# Altium footprint library 20210518.PcbLib: 414 footprints (part 9 of 26)
Each footprint in its own frame and in the unit in brackets; x right, y up, seen from the top. Pads: shape width x height; smd on the part's side, far side on the other; paste and mask are expansions set on the pad; w line width, h text height; cw(c..) or ccw(c..) is an arc to the next point about the centre after c.
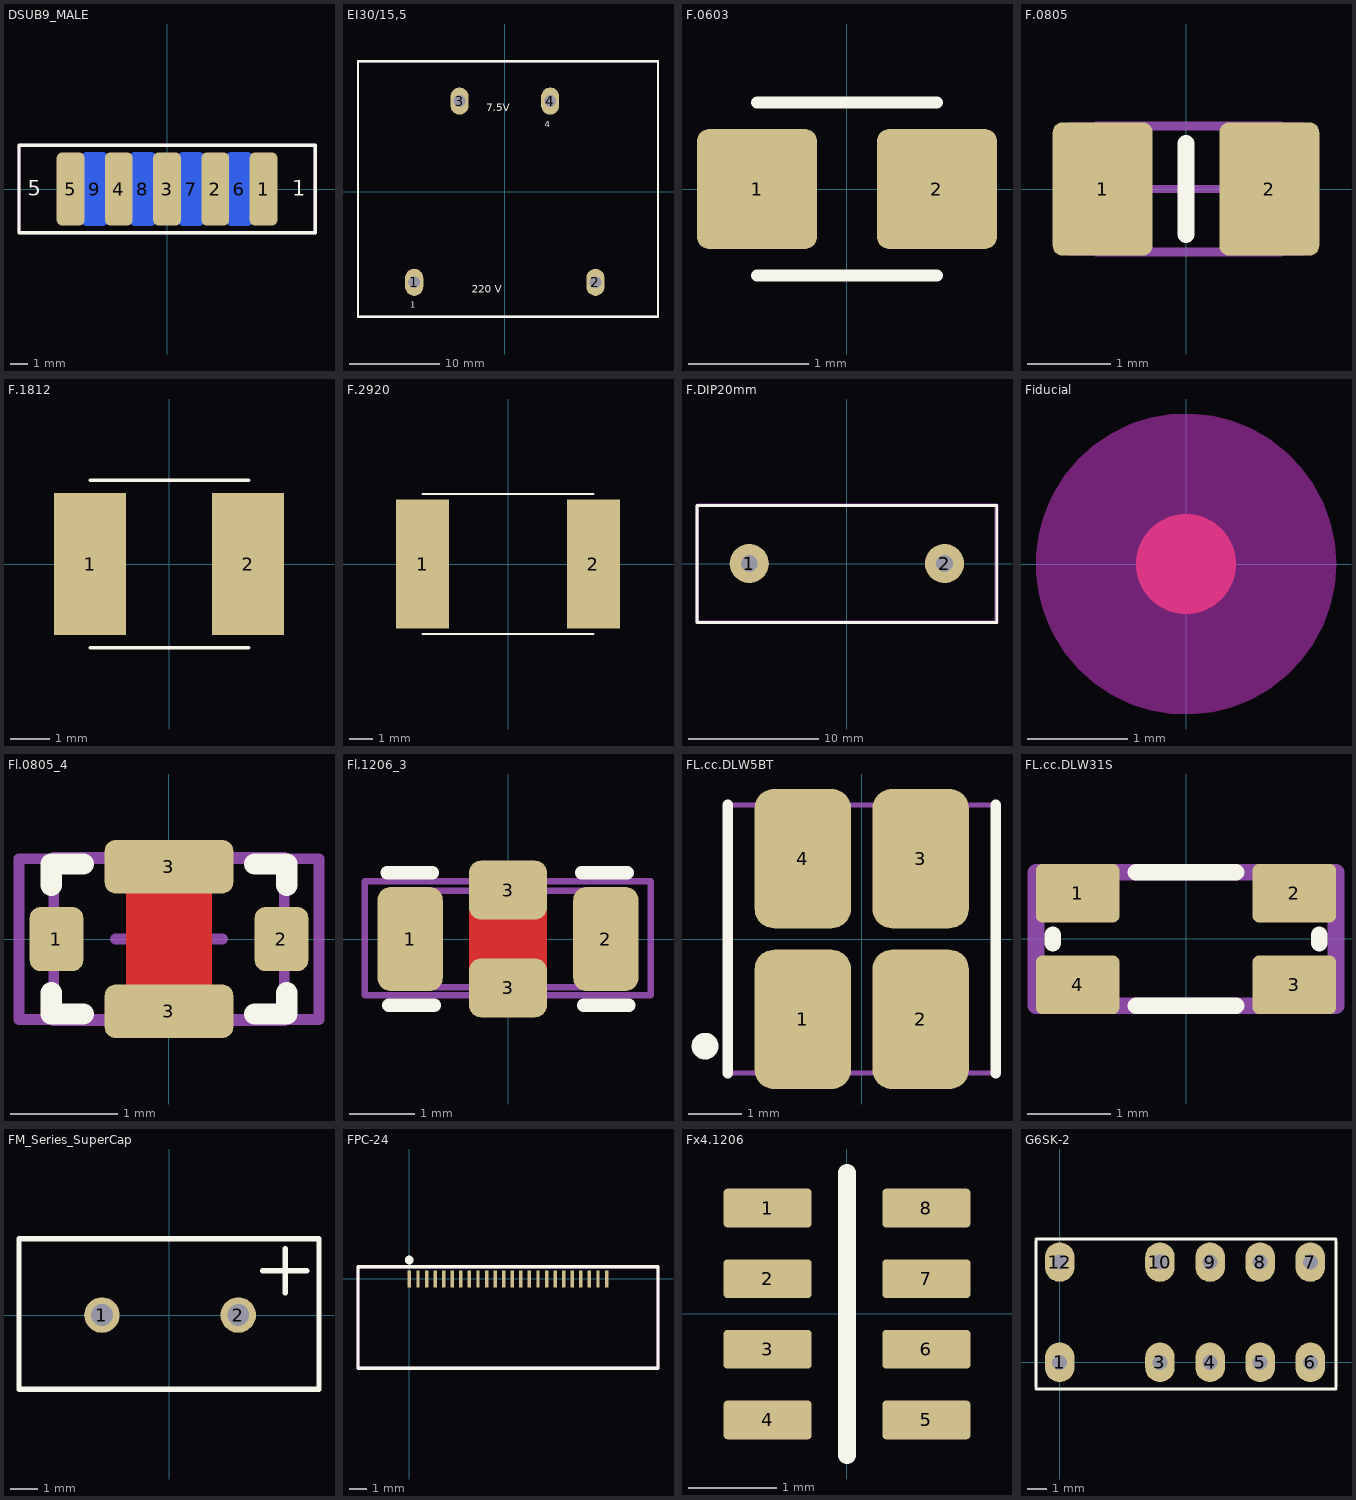
[diagram p8: the footprints below, top view; thin cyan lines are the x and y axes]

## DSUB9_MALE [mm] "Desub; 9 Position, 2.5mm pin space"
height 12.54
pads (9):
  rrect40% 1.6x4.2 smd paste-1: 1(5.54,0) 2(2.77,0) 3(0,0) 4(-2.77,0) 5(-5.54,0)
  rrect40% 1.6x4.2 smd far side paste-1: 6(4.155,0) 7(1.385,0) 8(-1.385,0) 9(-4.155,0)
Top Overlay:
  lines w0.2: -8.5,-2.5 -8.5,2.5 8.5,2.5 8.5,-2.5 -8.5,-2.5
  text "5" at -8,-0.7 h1.52
  text "1" at 7.2,-0.7 h1.52
Bottom Overlay:
  text "6" at 7.9,-0.7 h1.52
  text "9" at -7,-0.7 h1.52
Mechanical 13:
  lines w0.2: -8.5,-2.5 8.5,-2.5 8.5,2.5 -8.5,2.5 -8.5,-2.5
Mechanical 15:
  lines w0.2: -8.5,-2.5 8.5,-2.5 8.5,2.5 -8.5,2.5 -8.5,-2.5
3D body: height 6.21, standoff -6.21, extent -15.235,-0.466 15.435,13.83

## EI30/15,5 [mm]
pads (4):
  oval 2x3 / inner oval 2.5x3.5 / far side oval 2x3 hole 1.3: 1(-10,-10) 2(10,-10) 3(-5,10) 4(5,10)
Top Overlay:
  lines w0.254: -16.204,14.395 -16.204,-13.805 16.896,-13.805 16.896,14.395 ; -16.2,14.4 16.9,14.4
  text "4" at 4.388,6.866 h1.14
  text "1" at -10.461,-13.048 h1.14
  text "7.5V" at -2.068,8.588 h1.43
  text "220 V" at -3.643,-11.448 h1.43
Mechanical 13:
  lines w0.254: -16.2,14.3 -16.2,-13.8 16.9,-13.8 16.9,14.4 -16.2,14.4
Mechanical 15:
  lines w0.254: -16.2,-13.8 16.9,-13.8 16.9,14.4 -16.2,14.4 -16.2,-13.8
3D body: height 26.75, standoff -0.25, extent -16.1,-13.45 16.4,14.05

## F.0603 [mm] "Ferrite Bead, Body 1.6x0.8mm, IPC High Density"
height 0.9
pads (2):
  rrect20% 1x1 smd: 1(-0.75,0) 2(0.75,0)
Top Overlay:
  lines w0.1: -0.75,-0.72 0.75,-0.72 ; -0.75,0.72 0.75,0.72
3D body: height 0.48, standoff 0, extent -0.825,-0.425 0.825,0.425

## F.0805 [mm]
height 0.8
pads (2):
  rrect20% 1.2x1.6 smd: 1(-1,0) 2(1,0)
Top Overlay:
  lines w0.2: 0,-0.55 0,0.55
Mechanical 13:
  lines w0.1: -1.075,-0.762 1.143,-0.762 1.143,0.762 -1.075,0.762 -1.075,-0.762
Mechanical 15:
  lines w0.1: -0.5,0 0.5,0 ; 0,-0.5 0,0.5 ; -1.4,-0.75 1.4,-0.75 1.4,0.75 -1.4,0.75 -1.4,-0.75
3D body: height 0.78, standoff 0, extent -1,-0.625 1,0.625

## F.1812 [mil]
height 39.37
pads (2):
  rect 72x142 smd: 1(-79,0) 2(79,0)
Top Overlay:
  lines w3.94: -78.61,-83.72 79.39,-83.72 ; -78.61,83.72 79.39,83.72
3D body: height 51.97, standoff 0, extent -94.89,-63.39 94.88,63.38

## F.2920 [mm] "SMD fuse"
height 1
pads (2):
  rect 2.3x5.6 smd: 1(-3.7,0) 2(3.7,0)
Top Overlay:
  lines w0.1: -3.7,-3.03 3.7,-3.03 ; -3.7,3.03 3.7,3.03
3D body: height 1, standoff 0, extent -3.85,-2.65 3.85,2.65

## F.DIP20mm [mm]
pads (2):
  round 3 / inner round 4 / far side round 3 hole 1.3: 1(-7.5,0) 2(7.5,0)
Top Overlay:
  lines w0.203: -11.513,-4.521 11.499,-4.521 11.499,4.46 -11.513,4.46 -11.513,-4.521
Mechanical 13:
  lines w0.203: -11.513,-4.552 11.448,-4.552 11.448,4.46 -11.513,4.46 -11.513,-4.552
Mechanical 15:
  lines w0.254: -11.471,-4.512 -11.471,4.488 11.529,4.488 11.529,-4.512 -11.471,-4.512
3D body: height 12.96, standoff -2.9, extent -11.839,-4.519 12.161,4.564

## Fiducial [mm] "Electrolitic Radial Capacitor, 5mm pin space, 0.8mm Hole, 10.1mm diametre, 15.2 height"
height 15.2
Top Layer:
  circle w1: c0,0 r0
Top Layer keep-out:
  circle w0.01: c0,0 r1.5
Top Solder:
  circle w3: c0,0 r0.001
Keep-Out Layer:
  circle w3: c0,0 r0

## Fl.0805_4 [mm] "Chip Capacitor, Body 2.0x1.3mm, NFM21PS, IPC High Density"
height 0.58
pads (4):
  rrect40% 0.5x0.6 smd: 1(-1.05,0) 2(1.05,0)
  rrect40% 1.2x0.5 smd: 3(0,-0.675) 3(0,0.675)
Top Layer:
  lines w0.8: 0,-0.5 0,0.5
Top Overlay:
  lines w0.2: -1.1,-0.5 -1.1,-0.7 -0.8,-0.7 ; -1.1,0.5 -1.1,0.7 -0.8,0.7 ; 0.8,-0.7 1.1,-0.7 1.1,-0.5 ; 0.8,0.7 1.1,0.7 1.1,0.5
Mechanical 13:
  lines w0.1: -1.075,-0.762 -1.075,0.762 1.075,0.762 1.075,-0.762 -1.075,-0.762
Mechanical 15:
  lines w0.1: -0.5,0 0.5,0 ; 0,-0.5 0,0.5 ; -1.4,-0.75 -1.4,0.75 1.4,0.75 1.4,-0.75 -1.4,-0.75
3D body: height 0.85, standoff 0, extent -1,-0.625 1,0.625

## Fl.1206_3 [mm] "Chip Capacitor, Body 3.20mm x 1.60mm, IPC High Density"
height 0.58
pads (4):
  rrect40% 1x1.6 smd: 1(-1.5,0) 2(1.5,0)
  rrect40% 1.2x0.9 smd: 3(0,-0.75) 3(0,0.75)
Top Layer:
  lines w1.2: 0,-0.5 0,0.5
Top Overlay:
  lines w0.2: -1.854,1.016 -1.154,1.016 ; -1.829,-1.016 -1.129,-1.016 ; 1.129,1.016 1.829,1.016 ; 1.154,-1.016 1.854,-1.016
Mechanical 13:
  lines w0.1: -1.57,0.741 -1.57,-0.737 1.575,-0.737 1.575,0.737 -1.566,0.737
Mechanical 15:
  lines w0.1: -0.504,0 0.496,0 ; 0,-0.5 0,0.5 ; -2.2,-0.864 2.189,-0.864 2.189,0.889 -2.2,0.889 -2.2,-0.864
3D body: height 1.3, standoff 0, extent -1.6,-0.8 1.6,0.8

## FL.cc.DLW5BT [mm] "Common Mode Choke 2020 size"
height 2.35
pads (4):
  rrect40% 1.8x2.6 smd: 1(-1.1,-1.5) 2(1.1,-1.5) 3(1.1,1.5) 4(-1.1,1.5)
Top Overlay:
  circle w0.25: c-2.925,-2 r0.125
  lines w0.2: -2.5,-2.5 -2.5,2.5 ; 2.5,-2.5 2.5,2.5
Mechanical 13:
  lines w0.1: -2.5,-2.5 2.5,-2.5 2.5,2.5 -2.5,2.5 -2.5,-2.5
Mechanical 15:
  lines w0.1: -1.6,-1.5 -0.6,-1.5 ; -1.1,-2 -1.1,-1 ; -2.5,-2.5 2.5,-2.5 2.5,2.5 -2.5,2.5 -2.5,-2.5
3D body: height 2.35, standoff 0, extent -2.5,-2.5 2.5,2.5

## FL.cc.DLW31S [mm] "Common Mode Filter"
height 2
pads (4):
  rrect20% 1x0.7 smd: 1(-1.3,0.55) 2(1.3,0.55) 3(1.3,-0.55) 4(-1.3,-0.55)
Top Overlay:
  lines w0.2: -1.6,-0.05 -1.6,0.05 ; -0.6,-0.8 0.6,-0.8 ; -0.6,0.8 0.6,0.8 ; 1.6,-0.05 1.6,0.05
Mechanical 15:
  lines w0.2: -1.8,-0.8 1.8,-0.8 1.8,0.8 -1.8,0.8 -1.8,-0.8
3D body: height 1.97, standoff -0.02, extent -1.604,-0.807 1.604,0.807

## FM_Series_SuperCap [mil] "FM Series Supercapacitors (EDLCs)"
height 413.39
pads (2):
  round 51.18 / inner round 60 / far side round 51.18 hole 31.5: 1(-96.85,0) 2(100,0)
Top Overlay:
  lines w7.87: 135.43,64.17 198.82,64.17 ; 167.72,32.28 167.72,95.67 ; -216.54,-106.74 -216.54,109.99 216.53,109.99 216.53,-106.74 -216.54,-106.74
3D body: height 484.25, standoff -224.41, extent -216.54,-106.74 216.53,109.99

## FPC-24 [mm] "24 way 0.5 pitch FPC Connector"
pads (24):
  rect 0.2x1 smd: 1(0,0) 2(0.5,0) 3(1,0) 4(1.5,0) 5(2,0) 6(2.5,0) 7(3,0) 8(3.5,0) 9(4,0) 10(4.5,0) 11(5,0) 12(5.5,0) 13(6,0) 14(6.5,0) 15(7,0) 16(7.5,0) 17(8,0) 18(8.5,0) 19(9,0) 20(9.5,0) 21(10,0) 22(10.5,0) 23(11,0) 24(11.5,0)
Top Overlay:
  circle w0.5: c-0.01,1.1 r0.01
  lines w0.2: -3,-5.2 -3,0.7 14.5,0.7 14.5,-5.2 -3,-5.2
Mechanical 13:
  lines w0.2: -3,-5.2 -3,0.7 14.5,0.7 14.5,-5.2 -3,-5.2
Mechanical 15:
  lines w0.2: -3,-5.2 14.5,-5.2 14.5,0.7 -3,0.7 -3,-5.2
3D body: height 2, standoff -0.04, extent -2.95,-5.2 14.45,0.3

## Fx4.1206 [mm] "4xFerrite Berad, Body 3.2x1.6mm, IPC High Density"
height 0.45
pads (8):
  rrect20% 1x0.44 smd: 1(-0.9,1.2) 2(-0.9,0.4) 3(-0.9,-0.4) 4(-0.9,-1.2) 5(0.9,-1.2) 6(0.9,-0.4) 7(0.9,0.4) 8(0.9,1.2)
Top Overlay:
  lines w0.2: 0,-1.6 0,1.6
3D body: height 0.55, standoff 0, extent -0.8,-1.6 0.8,1.6

## G6SK-2 [mm]
pads (10):
  oval 1.5x2 hole 0.762: 1(0,0) 3(5.08,0) 4(7.62,0) 5(10.16,0) 6(12.7,0) 7(12.7,5.08) 8(10.16,5.08) 9(7.62,5.08) 10(5.08,5.08) 12(0,5.08)
Top Overlay:
  lines w0.15: -1.2,-1.35 14,-1.35 ; -1.2,-1.25 -1.2,6.15 ; -1.2,6.25 14,6.25 ; 14,-1.25 14,6.15
3D body: height 9.2, standoff -2.95, extent -1.04,-1.18 13.76,6.12